# Altium footprint library SMD-RCL.PcbLib: 111 footprints (part 4 of 7)
Each footprint in its own frame and in the unit in brackets; x right, y up, seen from the top. Pads: shape width x height; smd on the part's side, far side on the other; paste and mask are expansions set on the pad; w line width, h text height; cw(c..) or ccw(c..) is an arc to the next point about the centre after c.
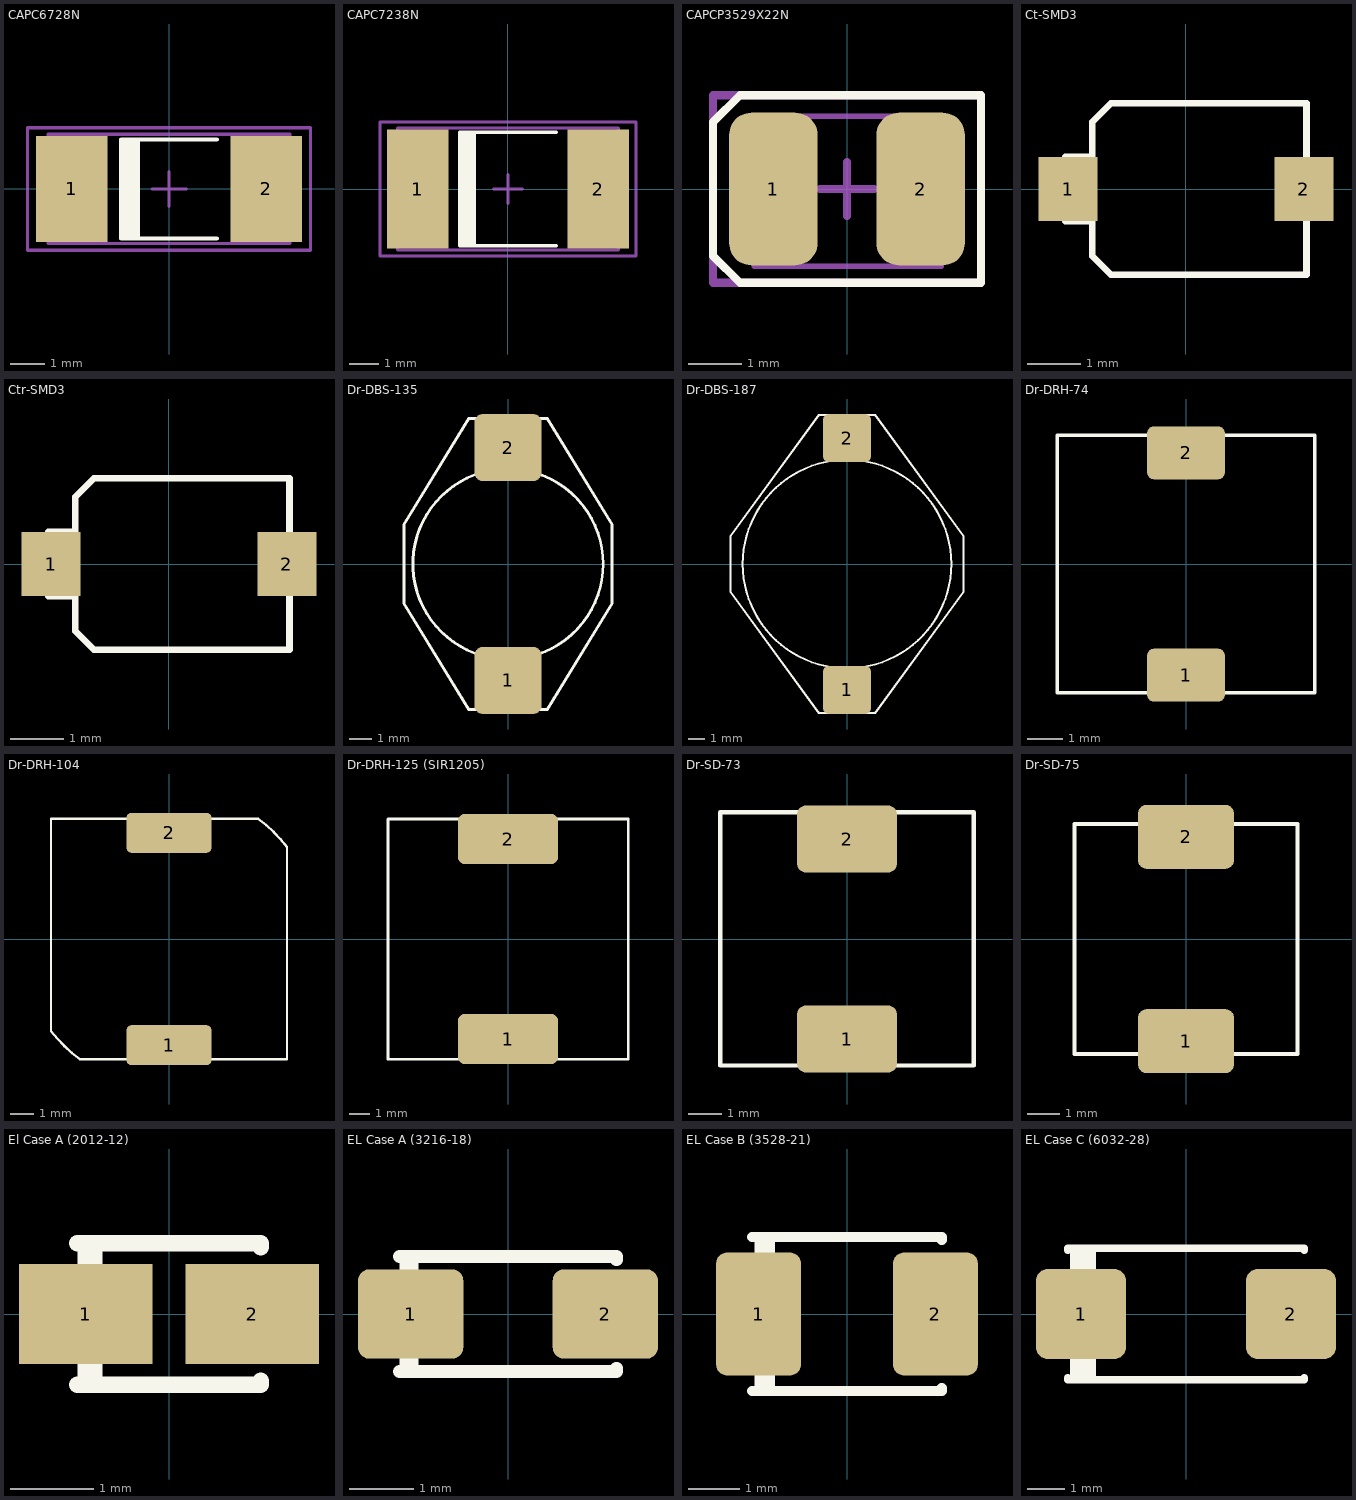
[diagram p3: the footprints below, top view; thin cyan lines are the x and y axes]

## CAPC6728N [mm] "Chip Capacitor, Body 6.7x2.8mm, IPC Medium Density"
height 3.18
pads (2):
  rect 2.1x3.1 smd: 1(-2.85,0) 2(2.85,0)
Top Overlay:
  rectangle: -1.4,-1.45 -0.85,1.45
  lines w0.125: 1.4,-1.45 -1.4,-1.45 -1.4,1.45 1.4,1.45
Assembly_draw:
  lines w0.1: -3.55,-1.6 3.55,-1.6 3.55,1.6 -3.55,1.6 -3.55,-1.6
Mechanical_clearance:
  lines w0.1: -0.5,0 0.5,0 ; 0,-0.5 0,0.5 ; -4.15,-1.8 4.15,-1.8 4.15,1.8 -4.15,1.8 -4.15,-1.8
3D body: height 3.18, standoff 0, extent -3.55,-1.6 3.55,1.6

## CAPC7238N [mm] "Chip Capacitor, Body 7.2x3.8mm, IPC Medium Density"
height 3.18
pads (2):
  rect 2.1x4.1 smd: 1(-3.1,0) 2(3.1,0)
Top Overlay:
  rectangle: -1.65,-1.95 -1.1,1.95
  lines w0.125: 1.65,-1.95 -1.65,-1.95 -1.65,1.95 1.65,1.95
Assembly_draw:
  lines w0.1: -3.8,-2.1 3.8,-2.1 3.8,2.1 -3.8,2.1 -3.8,-2.1
Mechanical_clearance:
  lines w0.1: -0.5,0 0.5,0 ; 0,-0.5 0,0.5 ; -4.4,-2.3 4.4,-2.3 4.4,2.3 -4.4,2.3 -4.4,-2.3
3D body: height 3.18, standoff 0, extent -3.8,-2.1 3.8,2.1

## CAPCP3529X22N [mm] "Chip Capacitor, 2-Leads, Body 3,50x2,88mm, IPC Medium Density"
height 2.2
pads (2):
  rrect50% 1.65x2.85 smd: 1(-1.375,0) 2(1.375,0)
Top Overlay:
  lines w0.15: -2.5,-1.25 -2.5,1.25 -2,1.75 2.5,1.75 2.5,-1.75 -2,-1.75 -2.5,-1.25
Assembly_draw:
  rectangle: -1.5,-1.4 -1.1,1.4
  lines w0.1: -1.788,-0.694 -1.788,0.606 ; -1.752,-1.144 -1.752,-0.694 ; -1.752,-1.144 -1.735,-1.144 -1.735,-0.694 -1.752,-0.694 ; -1.752,-1.144 -1.817,-1.144 -1.817,-0.694 -1.752,-0.694 ; -1.752,0.606 -1.752,1.056 ; -1.752,0.606 -1.817,0.606 -1.817,1.056 -1.752,1.056 ; -1.752,0.606 -1.735,0.606 -1.735,1.056 -1.752,1.056 ; -1.685,-1.444 -1.735,-1.444 -1.735,1.356 -1.685,1.356 ; -1.685,-1.444 -1.435,-1.444 1.715,-1.444 ; -1.685,-1.444 -1.685,1.356 ; -1.685,1.356 -1.435,1.356 1.715,1.356 ; 1.715,-1.444 1.765,-1.444 1.765,1.356 1.715,1.356 ; 1.715,-1.444 1.715,1.356 ; 1.781,-1.144 1.781,-0.419 ; 1.781,-1.144 1.765,-1.144 1.765,-0.419 1.781,-0.419 ; 1.781,-1.144 1.846,-1.144 1.846,-0.419 ; 1.781,-0.419 1.846,-0.419 ; 1.781,0.331 1.781,1.056 ; 1.781,0.331 1.846,0.331 ; 1.781,0.331 1.765,0.331 1.765,1.056 1.781,1.056 ; 1.781,1.056 1.846,1.056 1.846,0.331 ; 1.846,-0.419 1.846,0.331
Mechanical_clearance:
  lines w0.15: -0.5,0 0.5,0 ; 0,-0.5 0,0.5 ; -2.5,-1.75 -2.5,1.75 2.5,1.75 2.5,-1.75 -2.5,-1.75
3D body "User Library-QT02752.SLDPRT": height 1.95, standoff 0.04, extent -1.831,-1.4 1.831,1.4

## Ct-SMD3 [mm]
pads (2):
  rect 1.1x1.2 smd: 1(-2.2,0) 2(2.2,0)
Top Overlay:
  lines w0.125: -2.25,-0.6 -1.75,-0.6 -1.75,-1.25 -1.4,-1.6 2.25,-1.6 2.25,1.6 -1.4,1.6 -1.75,1.25 -1.75,0.6 -2.25,0.6 -2.25,-0.6
3D body "Cap Trimer SMD TZC3R100A110B00.STEP": height 1.6, standoff 0, extent -2.25,-1.6 2.25,1.6

## Ctr-SMD3 [mm]
pads (2):
  rect 1.1x1.2 smd: 1(-2.2,0) 2(2.2,0)
Top Overlay:
  lines w0.125: -2.25,-0.6 -2.25,0.6 -1.75,0.6 -1.75,1.25 -1.4,1.6 2.25,1.6 2.25,-1.6 -1.4,-1.6 -1.75,-1.25 -1.75,-0.6 -2.25,-0.6

## Dr-DBS-135 [mm]
pads (2):
  rrect25% 3x3 smd: 1(0,-5.2) 2(0,5.2)
Top Overlay:
  circle w0.125: c0,0 r4.25
  lines w0.125: -4.65,-1.75 -1.75,-6.5 1.75,-6.5 4.65,-1.75 4.65,1.75 1.75,6.5 -1.75,6.5 -4.65,1.75 -4.65,-1.75
3D body: height 1.3, standoff 0, extent -4.65,-6.5 4.65,6.5
3D body: height 5.4, standoff 0, extent -4.25,-4.25 4.25,4.25

## Dr-DBS-187 [mm]
pads (2):
  rrect25% 3x3 smd: 1(0,-7.85) 2(0,7.85)
Top Overlay:
  circle w0.125: c0,0 r6.5
  lines w0.125: -7.25,-1.75 -7.25,1.75 -1.75,9.3 1.75,9.3 7.25,1.75 7.25,-1.75 1.75,-9.3 -1.75,-9.3 -7.25,-1.75
3D body: height 7, standoff 0, extent -6.5,-6.5 6.5,6.5
3D body: height 1.3, standoff 0, extent -7.25,-9.25 7.25,9.25

## Dr-DRH-74 [mm]
pads (2):
  rrect25% 2.2x1.5 smd: 1(0,-3.15) 2(0,3.15)
Top Overlay:
  lines w0.1: -3.65,-3.65 3.65,-3.65 3.65,3.65 -3.65,3.65 -3.65,-3.65
3D body "DR-74.STEP": height 4.35, standoff 0, extent -3.65,-3.65 3.65,3.65

## Dr-DRH-104 [mm]
pads (2):
  rrect25% 3.6x1.7 smd: 1(0,-4.5) 2(0,4.5)
Top Overlay:
  lines w0.1: -3.794,-5.1 5,-5.1 5,3.9 ; -3.787,-5.092 cw(c0.007,0) -5,-3.905 -5,5.1 3.786,5.1 ; 3.786,5.093 cw(c-0.007,0) 5.003,3.902

## Dr-DRH-125 (SIR1205) [mm]
pads (2):
  rrect25% 5x2.5 smd: 1(0,-5) 2(0,5)
Top Overlay:
  lines w0.125: -6,-6 -6,6 6,6 6,-6 -6,-6
3D body: height 6, standoff 0, extent -6,-6 6,6

## Dr-SD-73 [mm] "7x7x3.2mm"
height 3.2
pads (2):
  rrect25% 3x2 smd: 1(0,-3) 2(0,3)
Top Overlay:
  lines w0.125: -3.8,-3.8 3.8,-3.8 3.8,3.8 -3.8,3.8 -3.8,-3.8
3D body "DR73-74.STEP": height 3.55, standoff 0, extent -3.8,-3.8 3.8,3.8

## Dr-SD-75 [mm] "7.3x7.3x5mm"
height 5
pads (2):
  rrect25% 3x2 smd: 1(0,-3.2) 2(0,3.2)
Top Overlay:
  lines w0.125: -3.5,-3.6 -3.5,3.6 3.5,3.6 3.5,-3.6 -3.5,-3.6
3D body "Dr SMD SLF7045T.STEP": height 4.51, standoff -0.1, extent -3.5,-3.6 3.5,3.6

## El Case A (2012-12) [mm] "Capacitor, SM Tantalum; Body 2.0 x 1.25 mm (LxW typ)"
height 1.2
pads (2):
  rect 1.6x1.2 smd: 1(-1,0) 2(1,0)
Top Overlay:
  rectangle: -1.1,-0.8 -0.8,0.8
  lines w0.2: -1.1,-0.85 1.1,-0.85 1.1,-0.8 ; -1.1,0.85 1.1,0.85 1.1,0.8

## EL Case A (3216-18) [mm] "Capacitor, SM Tantalum; Body 3.2 x 1.6 mm (LxW typ)"
height 1.8
pads (2):
  rrect25% 1.65x1.4 smd: 1(-1.525,0) 2(1.525,0)
Top Overlay:
  rectangle: -1.7,-0.8 -1.4,0.8
  lines w0.2: -1.7,-0.9 1.7,-0.9 1.7,-0.85 ; -1.7,0.9 1.7,0.9 1.7,0.85
3D body "EL Case A (3216-18).STEP": height 1.61, standoff 0, extent -1.595,-0.8 1.596,0.8

## EL Case B (3528-21) [mm] "Capacitor, SM Tantalum; Body 3.5 x 2.8 mm (LxW typ)"
height 2.1
pads (2):
  rrect25% 1.65x2.4 smd: 1(-1.725,0) 2(1.725,0)
Top Overlay:
  rectangle: -1.8,-1.4 -1.4,1.4
  lines w0.2: -1.85,-1.5 1.85,-1.5 1.85,-1.45 ; -1.85,1.5 1.85,1.5 1.85,1.45
3D body "EL Case B (3528-21).STEP": height 1.91, standoff 0, extent -1.746,-1.4 1.746,1.4

## EL Case C (6032-28) [mm] "Capacitor, SM Tantalum; Body 6.0 x 3.2 mm (LxW typ)"
height 2.8
pads (2):
  rrect25% 2.4x2.4 smd: 1(-2.8,0) 2(2.8,0)
Top Overlay:
  rectangle: -3.1,-1.7 -2.4,1.7
  lines w0.2: -3.15,-1.7 -3.15,-1.75 3.15,-1.75 3.15,-1.7 ; -3.15,1.7 -3.15,1.75 3.15,1.75 3.15,1.7
3D body "EL Case C (6032-28).STEP": height 2.51, standoff 0, extent -2.997,-1.6 2.997,1.6